# Altium footprint library 总库.PcbLib: 264 footprints (part 10 of 17)
Each footprint in its own frame and in the unit in brackets; x right, y up, seen from the top. Pads: shape width x height; smd on the part's side, far side on the other; paste and mask are expansions set on the pad; w line width, h text height; cw(c..) or ccw(c..) is an arc to the next point about the centre after c.
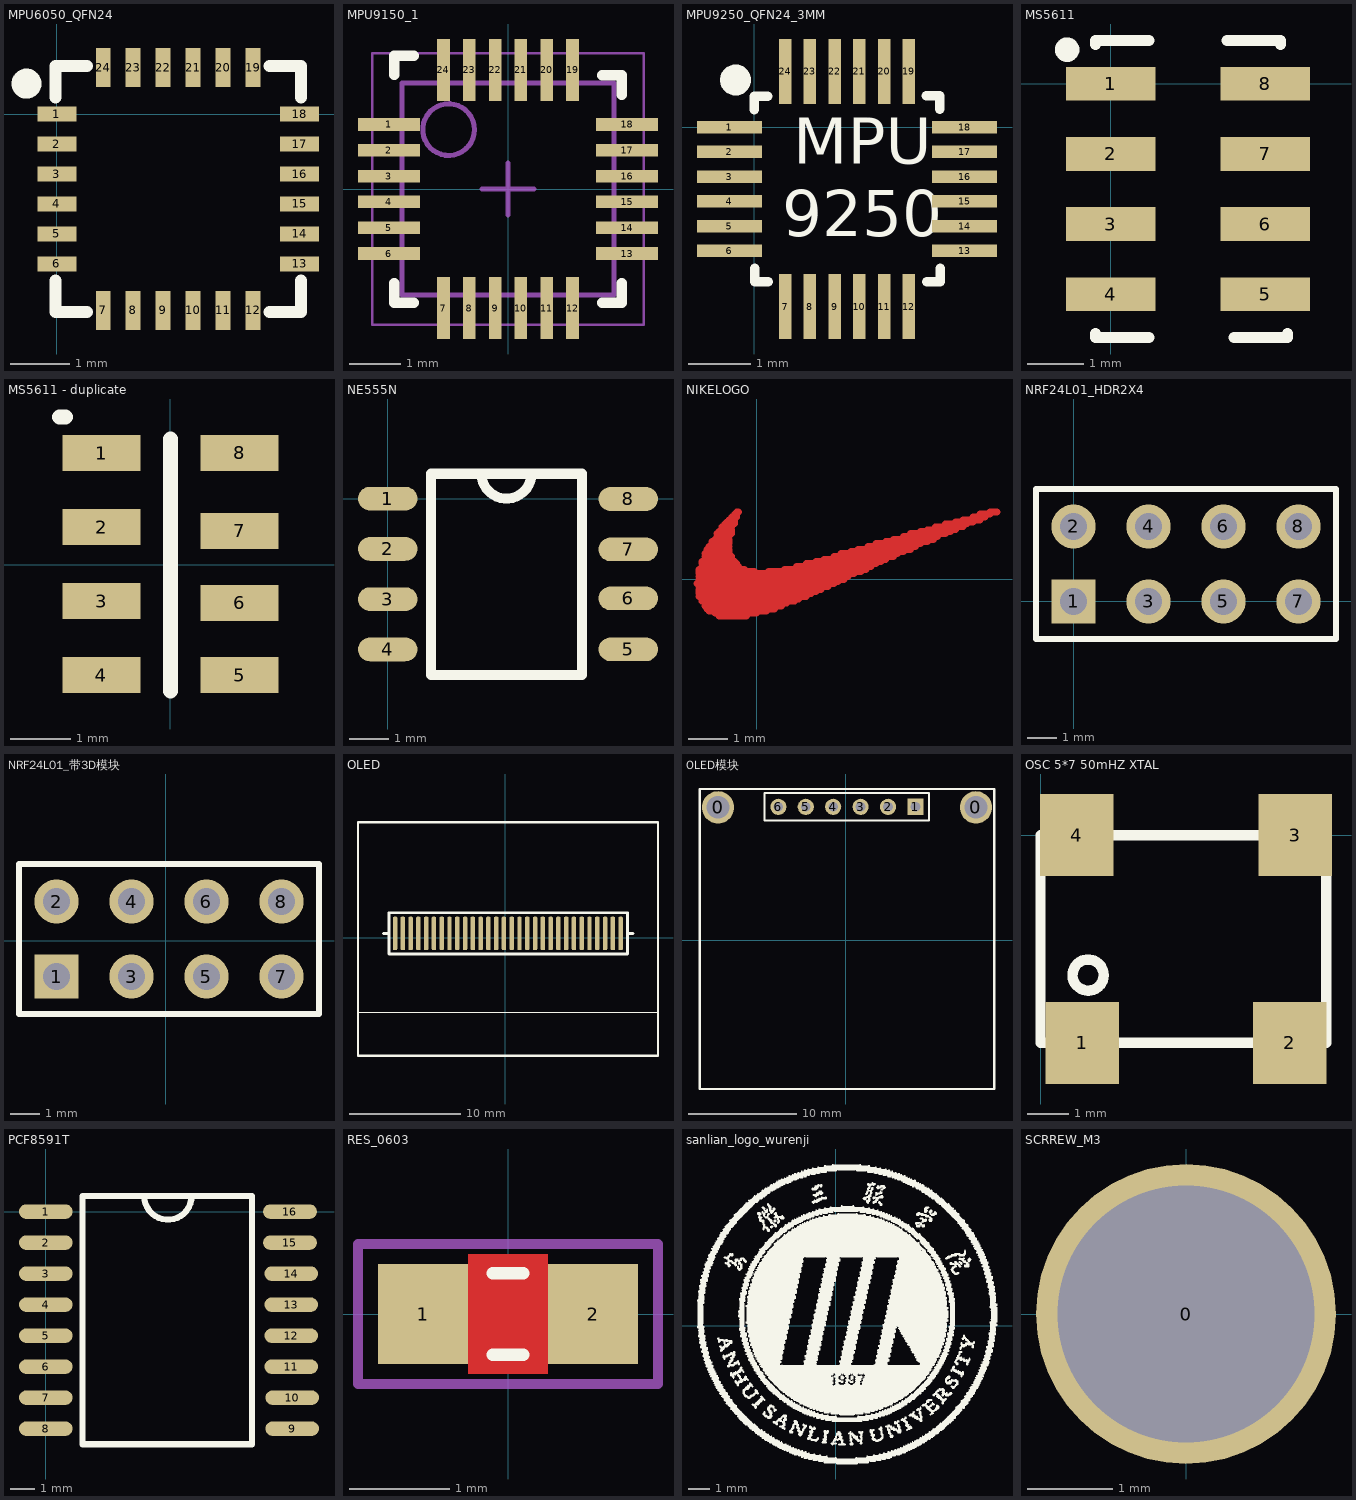
[diagram p9: the footprints below, top view; thin cyan lines are the x and y axes]

## MPU6050_QFN24 [mm] "QFN, 24-Leads, Body 4.1x4.1mm (max), Pitch 0.50mm, IPC Medium Density"
height 0.95
pads (24):
  rect 0.65x0.25 smd: 1(0,0) 2(0,-0.5) 3(0,-1) 4(0,-1.5) 5(0,-2) 6(0,-2.5) 13(4.05,-2.5) 14(4.05,-2) 15(4.05,-1.5) 16(4.05,-1) 17(4.05,-0.5) 18(4.05,0)
  rect 0.25x0.65 smd: 7(0.775,-3.275) 8(1.275,-3.275) 9(1.775,-3.275) 10(2.275,-3.275) 11(2.775,-3.275) 12(3.275,-3.275) 19(3.275,0.775) 20(2.775,0.775) 21(2.275,0.775) 22(1.775,0.775) 23(1.275,0.775) 24(0.775,0.775)
Top Overlay:
  circle w0.25: c-0.506,0.508 r0.125
  lines w0.2: -0.025,-2.775 -0.025,-3.3 0.5,-3.3 ; -0.025,0.275 -0.025,0.8 0.5,0.8 ; 3.55,-3.3 4.075,-3.3 4.075,-2.775 ; 3.55,0.8 4.075,0.8 4.075,0.275

## MPU9150_1 [mm] "QFN, 24-Leads, Body 4.00x4.00mm, Pitch 0.50mm, IPC Medium Density"
height 1.1
pads (24):
  rect 1.2x0.245 smd: 1(-2.304,1.25) 2(-2.304,0.75) 3(-2.304,0.25) 4(-2.304,-0.25) 5(-2.304,-0.75) 6(-2.304,-1.25) 13(2.304,-1.25) 14(2.304,-0.75) 15(2.304,-0.25) 16(2.304,0.25) 17(2.304,0.75) 18(2.304,1.25)
  rect 0.245x1.2 smd: 7(-1.25,-2.304) 8(-0.75,-2.304) 9(-0.25,-2.304) 10(0.25,-2.304) 11(0.75,-2.304) 12(1.25,-2.304) 19(1.25,2.304) 20(0.75,2.304) 21(0.25,2.304) 22(-0.25,2.304) 23(-0.75,2.304) 24(-1.25,2.304)
Top Overlay:
  lines w0.2: -2.2,-1.825 -2.2,-2.2 -1.825,-2.2 ; -2.2,2.206 -2.2,2.581 -1.825,2.581 ; 1.825,-2.2 2.2,-2.2 2.2,-1.825 ; 1.825,2.2 2.2,2.2 2.2,1.825
Mechanical 13:
  circle w0.1: c-1.15,1.15 r0.5
  lines w0.1: -2.05,-2.05 -2.05,2.05 2.05,2.05 2.05,-2.05 -2.05,-2.05
Mechanical 15:
  lines w0.05: -2.625,-2.625 -2.625,2.625 2.625,2.625 2.625,-2.625 -2.625,-2.625
  lines w0.1: -0.5,0 0.5,0 ; 0,-0.5 0,0.5
3D body: height 0.8, standoff 0, extent -2.032,-2.058 2.058,2.032

## MPU9250_QFN24_3MM [mm]
pads (24):
  rect 1.05x0.2 smd: 1(-0.4,0) 2(-0.4,-0.4) 3(-0.4,-0.8) 4(-0.4,-1.2) 5(-0.4,-1.6) 6(-0.4,-2) 13(3.4,-2) 14(3.4,-1.6) 15(3.4,-1.2) 16(3.4,-0.8) 17(3.4,-0.4) 18(3.4,0)
  rect 0.2x1.05 smd: 7(0.5,-2.9) 8(0.9,-2.9) 9(1.3,-2.9) 10(1.7,-2.9) 11(2.1,-2.9) 12(2.5,-2.9) 19(2.5,0.9) 20(2.1,0.9) 21(1.7,0.9) 22(1.3,0.9) 23(0.9,0.9) 24(0.5,0.9)
Top Overlay:
  circle w0.25: c-0.303,0.762 r0.125
  lines w0.152: 0,0.282 0,0.5 0.218,0.5 ; 0.005,-2.281 0.005,-2.499 0.224,-2.499 ; 2.781,0.511 2.999,0.511 2.999,0.292 ; 2.786,-2.499 3.005,-2.499 3.005,-2.281
  text "9250" at 0.457,-2.007 h1.27
  text "MPU" at 0.635,-0.838 h1.27
3D body: height 1.01, standoff 0, extent 0.271,-0.023 0.541,0.247
3D body: height 1, standoff 0, extent 0.001,-2.499 2.999,0.499

## MS5611 [mm] "QFN, 8-Leads, Body 5.00x3.00mm, Pitch 1.25mm/0.00mm, Thermal Pad 4.35x0.00mm, IPC Medium Density"
height 1
pads (8):
  rect 1.6x0.6 smd: 1(0,0) 2(0,-1.25) 3(0,-2.5) 4(0,-3.75) 5(2.754,-3.75) 6(2.754,-2.5) 7(2.754,-1.25) 8(2.754,0)
Top Overlay:
  circle w0.254: c-0.777,0.61 r0.092
  lines w0.2: -0.273,-4.45 -0.273,-4.525 0.677,-4.525 ; -0.273,0.7 -0.273,0.775 0.677,0.775 ; 2.077,0.775 3.027,0.775 3.027,0.7 ; 2.204,-4.525 3.154,-4.525 3.154,-4.45

## MS5611 - duplicate [mm]
pads (8):
  rect 1.3x0.6 smd: 1(-1.149,1.866) 2(-1.149,0.633) 3(-1.149,-0.601) 4(-1.151,-1.834) 5(1.151,-1.834) 6(1.151,-0.634) 7(1.151,0.566) 8(1.151,1.866)
Top Overlay:
  lines w0.254: -1.85,2.466 -1.75,2.466 ; 0,-2.1 0,2.1
3D body: height 1, standoff 0, extent -1.55,-2.234 1.55,2.266

## NE555N [mm]
pads (8):
  oval 1.5x0.6 smd: 1(0,0) 2(0,-1.27) 3(0,-2.54) 4(0,-3.81) 5(6.08,-3.805) 6(6.08,-2.517) 7(6.08,-1.28) 8(6.08,-0.008)
Top Overlay:
  lines w0.254: 2.37,0.63 ccw(c3,0.63) 3.63,0.63 ; 1.095,-4.45 4.905,-4.45 4.905,0.63 1.095,0.63 1.095,-4.45

## NIKELOGO [mm]
Top Layer:
  lines w0.178: -1.524,-0.102 1.981,-0.102 ; -1.473,-0.432 1.27,-0.432 ; -1.473,-0.356 1.397,-0.356 ; -1.473,-0.305 1.524,-0.305 ; -1.473,-0.254 1.651,-0.254 ; -1.473,-0.178 1.829,-0.178 ; -1.473,-0.051 2.083,-0.051 ; -1.473,0 2.235,0 ; -1.473,0.076 2.337,0.076 ; -1.473,0.152 2.489,0.152 ; -1.473,0.203 -0.051,0.203 ; -1.473,0.254 -0.305,0.254 ; -1.397,-0.559 0.965,-0.559 ; -1.397,-0.508 1.067,-0.508 ; -1.397,0.33 -0.457,0.33 ; -1.397,0.406 -0.508,0.406 ; -1.397,0.457 -0.559,0.457 ; -1.321,-0.686 0.635,-0.686 ; -1.321,-0.61 0.762,-0.61 ; -1.321,0.508 -0.635,0.508 ; -1.321,0.584 -0.635,0.584 ; -1.321,0.66 -0.711,0.66 ; -1.27,-0.762 0.457,-0.762 ; -1.27,0.711 -0.711,0.711 ; -1.27,0.762 -0.711,0.762 ; -1.219,-0.813 0.254,-0.813 ; -1.219,0.838 -0.711,0.838 ; -1.143,0.914 -0.711,0.914 ; -1.143,0.965 -0.711,0.965 ; -1.067,-0.864 0,-0.864 ; -1.067,1.016 -0.711,1.016 ; -1.016,1.092 -0.711,1.092 ; -1.016,1.168 -0.635,1.168 ; -0.965,-0.94 -0.254,-0.94 ; -0.965,1.219 -0.635,1.219 ; -0.889,1.27 -0.635,1.27 ; -0.889,1.346 -0.635,1.346 ; -0.813,1.422 -0.559,1.422 ; -0.762,1.473 -0.559,1.473 ; -0.711,1.524 -0.559,1.524 ; -0.635,1.6 -0.508,1.6 ; -0.559,1.676 -0.508,1.676 ; -0.508,1.727 -0.457,1.727 ; 0.305,0.203 2.667,0.203 ; 0.711,0.254 2.794,0.254 ; 1.016,0.33 2.921,0.33 ; 1.27,0.406 3.048,0.406 ; 1.524,0.457 3.175,0.457 ; 1.727,0.508 3.302,0.508 ; 1.981,0.584 3.505,0.584 ; 2.159,0.66 3.607,0.66 ; 2.413,0.711 3.759,0.711 ; 2.591,0.762 3.937,0.762 ; 2.845,0.838 4.064,0.838 ; 3.048,0.914 4.191,0.914 ; 3.302,0.965 4.369,0.965 ; 3.505,1.016 4.521,1.016 ; 3.759,1.092 4.623,1.092 ; 3.937,1.168 4.826,1.168 ; 4.191,1.219 4.953,1.219 ; 4.369,1.27 5.08,1.27 ; 4.572,1.346 5.283,1.346 ; 4.826,1.422 5.385,1.422 ; 5.08,1.473 5.537,1.473 ; 5.283,1.524 5.715,1.524 ; 5.537,1.6 5.842,1.6 ; 5.715,1.676 5.969,1.676 ; 5.969,1.727 6.147,1.727

## NRF24L01_HDR2X4 [mm] "Connector; Header; 4x2 Position"
pads (8):
  rect 1.5x1.5 hole 0.9: 1(0,0)
  round 1.5 hole 0.9: 2(0,2.54) 3(2.54,0) 4(2.54,2.54) 5(5.08,0) 6(5.08,2.54) 7(7.62,0) 8(7.62,2.54)
Top Overlay:
  lines w0.2: -1.27,-1.27 -1.27,3.81 8.89,3.81 8.89,-1.27 -1.27,-1.27
3D body: height 4.5, standoff -3.15, extent -1.27,-1.27 8.89,3.81

## NRF24L01_带3D模块 [mm]
pads (8):
  rect 1.5x1.5 hole 0.9: 1(-3.696,-1.218)
  round 1.5 hole 0.9: 2(-3.696,1.322) 3(-1.156,-1.218) 4(-1.156,1.322) 5(1.384,-1.218) 6(1.384,1.322) 7(3.924,-1.218) 8(3.924,1.322)
Top Overlay:
  lines w0.2: -4.966,-2.488 5.194,-2.488 5.194,2.592 -4.966,2.592 -4.966,-2.488
3D body: height 14.93, standoff 0.02, extent -5.316,-2.87 9.684,26.13

## OLED [mm]
pads (30):
  rrect50% 0.4x3 smd: 1(-9.896,0.381) 2(-9.196,0.381) 3(-8.496,0.381) 4(-7.796,0.381) 5(-7.096,0.381) 6(-6.396,0.381) 7(-5.696,0.381) 8(-4.996,0.381) 9(-4.296,0.381) 10(-3.596,0.381) 11(-2.896,0.381) 12(-2.196,0.381) 13(-1.496,0.381) 14(-0.796,0.381) 15(-0.096,0.381) 16(0.604,0.381) 17(1.304,0.381) 18(2.004,0.381) 19(2.704,0.381) 20(3.404,0.381) 21(4.104,0.381) 22(4.804,0.381) 23(5.504,0.381) 24(6.204,0.381) 25(6.904,0.381) 26(7.604,0.381) 27(8.304,0.381) 28(9.004,0.381) 29(9.704,0.381) 30(10.404,0.381)
Top Overlay:
  lines w0.1: -13.231,-6.731 13.769,-6.731
  lines w0.2: -13.231,-10.622 0.269,-10.622 13.769,-10.622 13.769,10.378 0.269,10.378 -13.231,10.378 -13.231,-10.622
  lines w0.254: -10.937,0.381 -10.455,0.381 ; 11.034,0.381 11.516,0.381 ; -10.455,-1.473 -10.455,2.235 11.034,2.235 11.034,-1.473 -10.455,-1.473
3D body: height 1, standoff 0.5, extent -13.23,-10.621 13.769,-6.732
3D body: height 1, standoff 0, extent -12.7,-6.096 13.208,9.779
3D body: height 1, standoff 0, extent -12.699,-6.73 13.207,-6.097
3D body: height 1, standoff 0, extent 13.209,-6.73 13.769,10.378
3D body: height 1, standoff 0, extent -12.699,9.78 13.207,10.378
3D body: height 1, standoff 0, extent -13.23,-6.73 -12.701,10.378

## OLED模块 [mm]
pads (8):
  round 3 hole 2.1: 0(-11.835,12.319) 0(12.065,12.319)
  rect 1.5x1.5 hole 0.9: 1(6.455,12.368)
  round 1.5 hole 0.9: 2(3.915,12.368) 3(1.375,12.368) 4(-1.165,12.368) 5(-3.705,12.368) 6(-6.245,12.368)
Top Overlay:
  lines w0.2: -7.515,11.098 7.725,11.098 7.725,13.638 -7.515,13.638 -7.515,11.098
  lines w0.203: -13.535,-13.781 13.765,-13.781 13.765,14.019 -13.535,14.019 -13.535,-13.781

## OSC 5*7 50mHZ XTAL [mm]
pads (4):
  rect 1.8x2 smd: 1(1.016,-5.08) 2(6.096,-5.08) 3(6.223,0) 4(0.889,0)
Top Overlay:
  lines w0.254: 1.503,-3.252 ccw(c1.163,-3.422) 1.524,-3.302 ; 0,-5.08 6.985,-5.08 6.985,0 0,0 0,-5.08

## PCF8591T [mm]
pads (16):
  oval 2.2x0.6 smd: 1(0,0) 2(0,-1.27) 3(0,-2.54) 4(0,-3.81) 5(0,-5.08) 6(0,-6.35) 7(0,-7.62) 8(0,-8.89) 9(10.088,-8.89) 10(10.088,-7.62) 11(10.049,-6.35) 12(10.049,-5.08) 13(10.049,-3.81) 14(10.049,-2.54) 15(10,-1.27) 16(10,0)
Top Overlay:
  lines w0.254: 1.505,-9.525 1.505,0.635 ; 1.561,-9.525 8.439,-9.525 8.439,0.635 1.561,0.635 ; 4.033,0.635 ccw(c5,0.635) 5.967,0.635

## RES_0603 [mm]
height 0.8
pads (2):
  rect 0.9x1 smd: 1(-0.85,0) 2(0.85,0)
Top Layer:
  pour cut-out: -0.4,0.6 0.4,0.6 0.4,-0.6 -0.4,-0.6
Top Overlay:
  lines w0.127: -0.152,-0.406 0.152,-0.406 ; -0.152,0.406 0.152,0.406
Mechanical 13:
  lines w0.05: -0.875,-0.475 -0.875,0.475 -0.475,0.475 -0.475,-0.475 -0.875,-0.475 ; -0.475,-0.474 0.475,-0.474 -0.475,-0.474 ; -0.475,0.474 0.475,0.474 -0.475,0.474 ; 0.475,-0.475 0.875,-0.475 0.875,0.475 0.475,0.475 0.475,-0.475
Mechanical 14:
  lines w0.1: -1.5,-0.7 1.5,-0.7 1.5,0.7 -1.5,0.7 -1.5,-0.7
3D body: height 0.54, standoff -0.01, extent -0.875,-0.475 0.875,0.475

## sanlian_logo_wurenji [mm]
Top Overlay:
  drawing of 4950 lines, arcs and shapes, not listed

## SCRREW_M3 [mm]
height 10.058
pads (1):
  round 3.5 hole 3: 0(0,0)